# Altium footprint library cool_library.PcbLib: 1182 footprints (part 59 of 75)
Each footprint in its own frame and in the unit in brackets; x right, y up, seen from the top. Pads: shape width x height; smd on the part's side, far side on the other; paste and mask are expansions set on the pad; w line width, h text height; cw(c..) or ccw(c..) is an arc to the next point about the centre after c.
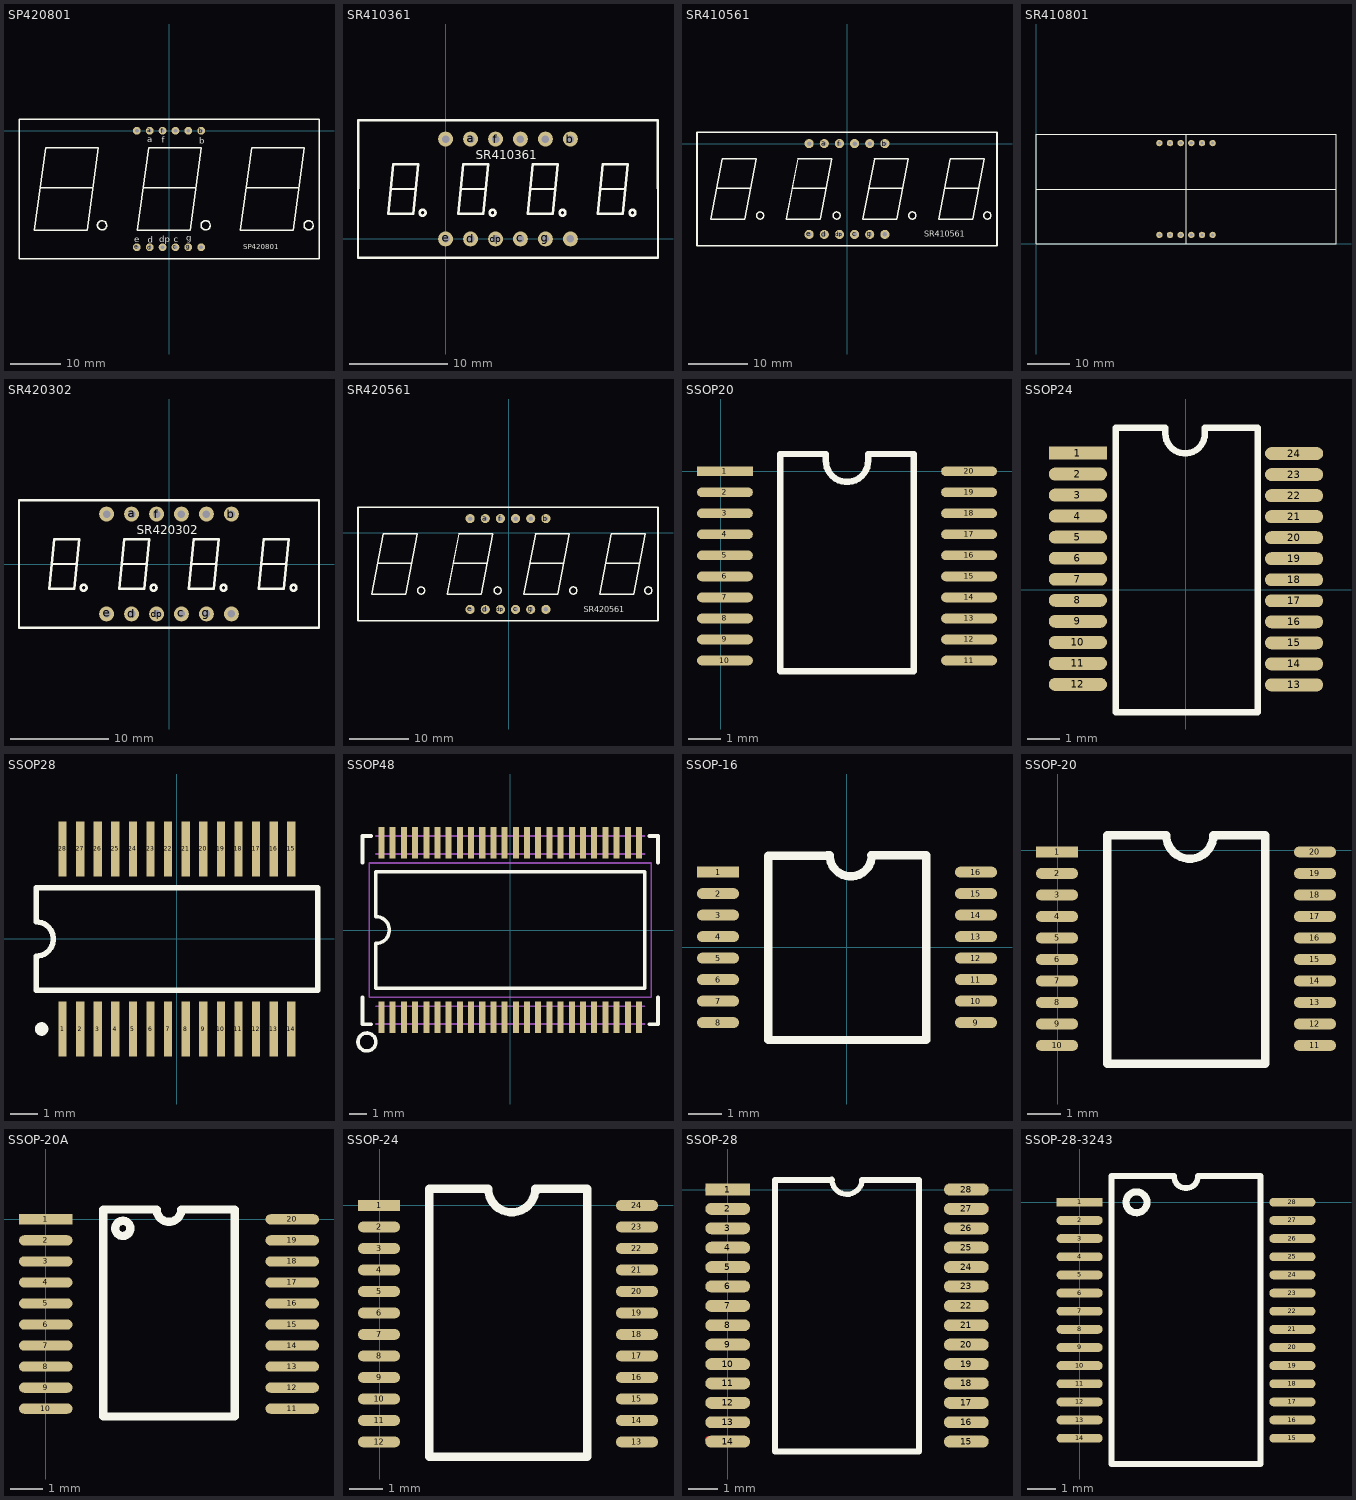
[diagram p58: the footprints below, top view; thin cyan lines are the x and y axes]

## SP420801 [mil]
pads (12):
  round 60 hole 30: a(-150,0) b(250,0) c(50,-905.51) com1(-250,0) com2(50,0) com3(150,0) d(-150,-905.51) dp(-50,-905.51) e(-250,-905.51) f(-50,0) g(150,-905.51) nc(250,-905.51)
Top Overlay:
  circle w10: c-520.43,-735 r35.43
  circle w10: c284.57,-735 r35.43
  circle w10: c1084.57,-735 r35.43
  lines w8: -1002.2,-439.37 -998.26,-443.31 ; -592.75,-443.31 -588.81,-439.37 ; -202.2,-439.37 -198.26,-443.31 ; 207.25,-443.31 211.19,-439.37 ; 597.8,-439.37 601.74,-443.31 ; 1007.25,-443.31 1011.19,-439.37
  lines w10: -998.26,-443.31 -592.75,-443.31 ; -198.26,-443.31 207.25,-443.31 ; 601.74,-443.31 1007.25,-443.31 ; -1165.35,-994.1 1165.35,-994.1 1165.35,88.58 -1165.35,88.58 -1165.35,-994.1 ; -1045.5,-774.02 -958.89,-132.28 -549.44,-132.28 -636.05,-774.02 -1045.5,-774.02 ; -245.5,-774.02 -158.89,-132.28 250.56,-132.28 163.94,-774.02 -245.5,-774.02 ; 554.5,-774.02 641.11,-132.28 1050.56,-132.28 963.95,-774.02 554.5,-774.02
  text "SP420801" at 575,-920 h40
  text "e" at -270,-865 h47.24
  text "d" at -165,-870 h47.24
  text "dp" at -75,-865 h47.24
  text "c" at 35,-865 h47.24
  text "g" at 135,-855 h47.24
  text "b" at 235,-100 h47.24
  text "f" at -55,-95 h47.24
  text "a" at -170,-90 h47.24

## SR410361 [mil]
height 50
pads (12):
  round 60 hole 30: a(100,400) b(500,400) c(300,0) com1(0,400) com2(300,400) com3(400,400) com4(500,0) d(100,0) dp(200,0) e(0,0) f(200,400) g(400,0)
Top Overlay:
  circle w10: c748.19,105 r11.81
  circle w10: c-91.81,105 r11.81
  circle w10: c188.19,105 r11.81
  circle w10: c468.19,105 r11.81
  lines w10: -350.39,475.59 850.39,475.59 ; -350,475.59 -350.41,-75.59 850.39,-75.59 850,475.59 ; -220,200 -120,200 ; 60,200 160,200 ; 340,200 440,200 ; 620,200 720,200 ; -230,100 -210,300 -110,300 -130,100 -230,100 ; 50,100 150,100 170,300 70,300 50,100 ; 330,100 430,100 450,300 350,300 330,100 ; 610,100 630,300 730,300 710,100 610,100
  text "SR410361" at 120,320 h35

## SR410561 [mil]
pads (12):
  round 60 hole 30: a(-150,0) b(250,0) c(50,-600) com1(-250,0) com2(50,0) com3(150,0) com4(250,-600) d(-150,-600) dp(-50,-600) e(-250,-600) f(-50,0) g(150,-600)
Top Overlay:
  circle w10: c-573.62,-475 r23.62
  circle w10: c-68.62,-475 r23.62
  circle w10: c431.38,-475 r23.62
  circle w10: c926.38,-475 r23.62
  lines w10: -854.33,-295 -640,-295 ; -358.27,-295 -140,-295 ; 145.67,-295 365,-295 ; 645.67,-295 865,-295 ; -990.16,-674.02 990.16,-674.02 990.16,74.02 -990.16,74.02 -990.16,-674.02 ; -900,-500 -823.46,-100 -600,-100 -676.54,-500 -900,-500 ; -400,-500 -323.45,-100 -100,-100 -176.54,-500 -400,-500 ; 105,-500 181.54,-100 405,-100 328.45,-500 105,-500 ; 605,-500 681.54,-100 905,-100 828.46,-500 605,-500
  text "SR410561" at 510,-615 h39.37

## SR410801 [mil]
pads (12):
  round 60 hole 30: 1(1157.48,80.71) 2(1257.48,80.71) 3(1357.48,80.71) 4(1457.48,80.71) 5(1557.48,80.71) 6(1657.48,80.71) 7(1657.48,942.91) 8(1557.48,942.91) 9(1457.48,942.91) 10(1357.48,942.91) 11(1257.48,942.91) 12(1157.48,942.91)
Top Overlay:
  lines w10: 0,511.81 2814.96,511.81 ; 1407.48,0 1407.48,1023.62 ; 0,0 2814.96,0 2814.96,1023.62 0,1023.62 0,0

## SR420302 [mil]
height 50
pads (12):
  round 60 hole 30: a(-150,200) b(250,200) c(50,-200) com1(-250,200) com2(50,200) com3(150,200) com4(250,-200) d(-150,-200) dp(-50,-200) e(-250,-200) f(-50,200) g(150,-200)
Top Overlay:
  circle w10: c498.19,-95 r11.81
  circle w10: c-341.81,-95 r11.81
  circle w10: c-61.81,-95 r11.81
  circle w10: c218.19,-95 r11.81
  lines w10: -470,0 -370,0 ; -190,0 -90,0 ; 90,0 190,0 ; 370,0 470,0 ; -600.39,-255.91 600.39,-255.91 600.39,255.91 -600.39,255.91 -600.39,-255.91 ; -480,-100 -460,100 -360,100 -380,-100 -480,-100 ; -200,-100 -100,-100 -80,100 -180,100 -200,-100 ; 80,-100 180,-100 200,100 100,100 80,-100 ; 360,-100 380,100 480,100 460,-100 360,-100
  text "SR420302" at -130,120 h35

## SR420561 [mil]
pads (12):
  round 60 hole 30: a(-155,95) b(245,95) c(45,-505) com1(-255,95) com2(45,95) com3(145,95) com4(245,-505) d(-155,-505) dp(-55,-505) e(-255,-505) f(-55,95) g(145,-505)
Top Overlay:
  circle w10: c921.38,-380 r23.62
  circle w10: c426.38,-380 r23.62
  circle w10: c-73.62,-380 r23.62
  circle w10: c-578.62,-380 r23.62
  lines w10: -859.33,-200 -645,-200 ; -363.27,-200 -145,-200 ; 140.67,-200 360,-200 ; 640.67,-200 860,-200 ; -995.16,-579.02 -995.16,169.02 985.16,169.02 985.16,-579.02 -995.16,-579.02 ; -905,-405 -681.54,-405 -605,-5 -828.46,-5 -905,-405 ; -405,-405 -181.54,-405 -105,-5 -328.45,-5 -405,-405 ; 100,-405 323.45,-405 400,-5 176.54,-5 100,-405 ; 600,-405 823.46,-405 900,-5 676.54,-5 600,-405
  text "SR420561" at 495,-525 h39.37

## SSOP20 [mm]
pads (20):
  rect 1.727x0.3 smd: 1(0.127,0)
  oval 1.727x0.3 smd: 2(0.127,-0.65) 3(0.127,-1.3) 4(0.127,-1.95) 5(0.127,-2.6) 6(0.127,-3.25) 7(0.127,-3.9) 8(0.127,-4.55) 9(0.127,-5.2) 10(0.127,-5.85) 11(7.673,-5.85) 12(7.673,-5.2) 13(7.673,-4.55) 14(7.673,-3.9) 15(7.673,-3.25) 16(7.673,-2.6) 17(7.673,-1.95) 18(7.673,-1.3) 19(7.673,-0.65) 20(7.673,0)
Top Overlay:
  lines w0.2: 1.835,-6.175 5.965,-6.175 5.965,0.533 4.555,0.533 4.555,0.325 cw(c3.9,0.325) 3.245,0.325 3.245,0.533 1.835,0.533 1.835,-6.175
3D body: height 1.79, standoff -0.05, extent -0.013,-6.52 7.887,0.78

## SSOP24 [mm]
pads (24):
  rect 1.8x0.4 smd: 1(-3.326,4.229)
  oval 1.8x0.4 smd: 2(-3.326,3.579) 3(-3.326,2.93) 4(-3.326,2.28) 5(-3.326,1.63) 6(-3.326,0.981) 7(-3.326,0.331) 8(-3.326,-0.319) 9(-3.326,-0.968) 10(-3.326,-1.618) 11(-3.326,-2.267) 12(-3.326,-2.917) 13(3.353,-2.932) 14(3.353,-2.282) 15(3.353,-1.632) 16(3.353,-0.983) 17(3.353,-0.333) 18(3.353,0.316) 19(3.353,0.966) 20(3.353,1.616) 21(3.353,2.265) 22(3.353,2.915) 23(3.353,3.565) 24(3.354,4.214)
Top Overlay:
  lines w0.2: -2.159,-3.785 -2.159,5.01 -0.622,5.01 -0.622,4.827 ccw(c-0.013,4.827) 0.597,4.827 0.597,5.01 2.235,5.01 2.235,-3.785 -2.159,-3.785
3D body: height 1.78, standoff -0.21, extent -3.924,-3.654 3.976,4.976

## SSOP28 [mm]
pads (28):
  rect 0.305x2.05 smd: 1(-4.225,-3.325) 2(-3.575,-3.325) 3(-2.925,-3.325) 4(-2.275,-3.325) 5(-1.625,-3.325) 6(-0.975,-3.325) 7(-0.325,-3.325) 8(0.325,-3.325) 9(0.975,-3.325) 10(1.625,-3.325) 11(2.275,-3.325) 12(2.925,-3.325) 13(3.575,-3.325) 14(4.225,-3.325) 15(4.225,3.325) 16(3.575,3.325) 17(2.925,3.325) 18(2.275,3.325) 19(1.625,3.325) 20(0.975,3.325) 21(0.325,3.325) 22(-0.325,3.325) 23(-0.975,3.325) 24(-1.625,3.325) 25(-2.275,3.325) 26(-2.925,3.325) 27(-3.575,3.325) 28(-4.225,3.325)
Top Overlay:
  circle w0.25: c-5,-3.325 r0.125
  lines w0.2: -5.2,-1.9 -5.2,-0.633 ccw(c-5.2,0) -5.2,0.633 -5.2,1.9 5.2,1.9 5.2,-1.9 -5.2,-1.9

## SSOP48 [mil] "48-Lead Shrink Small-Outline Package"
height 110
pads (48):
  rect 13.5x70 smd: 1(-287.5,-195) 2(-262.5,-195) 3(-237.5,-195) 4(-212.5,-195) 5(-187.5,-195) 6(-162.5,-195) 7(-137.5,-195) 8(-112.5,-195) 9(-87.5,-195) 10(-62.5,-195) 11(-37.5,-195) 12(-12.5,-195) 13(12.5,-195) 14(37.5,-195) 15(62.5,-195) 16(87.5,-195) 17(112.5,-195) 18(137.5,-195) 19(162.5,-195) 20(187.5,-195) 21(212.5,-195) 22(237.5,-195) 23(262.5,-195) 24(287.5,-195) 25(287.5,195) 26(262.5,195) 27(237.5,195) 28(212.5,195) 29(187.5,195) 30(162.5,195) 31(137.5,195) 32(112.5,195) 33(87.5,195) 34(62.5,195) 35(37.5,195) 36(12.5,195) 37(-12.5,195) 38(-37.5,195) 39(-62.5,195) 40(-87.5,195) 41(-112.5,195) 42(-137.5,195) 43(-162.5,195) 44(-187.5,195) 45(-212.5,195) 46(-237.5,195) 47(-262.5,195) 48(-287.5,195)
Top Overlay:
  circle w8: c-320,-250 r20
  lines w8: -330,-150 -330,-210 -310,-210 ; -330,150 -330,210 -310,210 ; 310,-210 330,-210 330,-150 ; 310,210 330,210 330,150 ; -300,-130 -300,-30 ccw(c-300,0) -300,30 -300,130 300,130 300,-130 -300,-130
Mechanical 1:
  lines w4: -300,-210 300,-210 ; -300,-170 300,-170 ; -300,170 300,170 ; -300,210 300,210 ; -315,-150 315,-150 315,150 -315,150 -315,-150

## SSOP-16 [mm]
pads (16):
  rect 1.27x0.33 smd: 1(-3.9,2.275)
  oval 1.27x0.33 smd: 2(-3.9,1.625) 3(-3.9,0.975) 4(-3.9,0.325) 5(-3.9,-0.325) 6(-3.9,-0.975) 7(-3.9,-1.625) 8(-3.9,-2.275) 9(3.9,-2.275) 10(3.9,-1.625) 11(3.9,-0.975) 12(3.9,-0.325) 13(3.9,0.325) 14(3.9,0.975) 15(3.9,1.625) 16(3.9,2.275)
Top Overlay:
  lines w0.254: -2.376,-2.8 -2.376,2.775 -0.606,2.775 -0.598,2.783 ; -2.325,-2.8 2.399,-2.8 2.399,2.775 2.391,2.783 0.725,2.783 ; -0.522,2.783 ccw(c0.113,2.783) 0.748,2.783

## SSOP-20 [mm]
pads (20):
  rect 1.27x0.33 smd: 1(-0.025,-0.051)
  oval 1.27x0.33 smd: 2(-0.025,-0.701) 3(-0.025,-1.351) 4(-0.025,-2.001) 5(-0.025,-2.651) 6(-0.025,-3.301) 7(-0.025,-3.951) 8(-0.025,-4.601) 9(-0.025,-5.251) 10(-0.025,-5.901) 11(7.775,-5.901) 12(7.775,-5.251) 13(7.775,-4.601) 14(7.775,-3.951) 15(7.775,-3.301) 16(7.775,-2.651) 17(7.775,-2.001) 18(7.775,-1.351) 19(7.775,-0.701) 20(7.775,-0.051)
Top Overlay:
  lines w0.254: 6.223,-6.45 1.499,-6.45 1.499,0.449 3.269,0.449 3.277,0.457 ccw(c3.99,0.457) 4.703,0.457 6.266,0.457 6.274,0.449 6.274,-6.45

## SSOP-20A [mil]
pads (20):
  rect 65x12.5 smd: 1(0,0)
  oval 65x12.5 smd: 2(0,-25.59) 3(0,-51.18) 4(0,-76.77) 5(0,-102.36) 6(0,-127.95) 7(0,-153.54) 8(0,-179.13) 9(0,-204.72) 10(0,-230.31) 11(300,-230.31) 12(300,-204.72) 13(300,-179.13) 14(300,-153.54) 15(300,-127.95) 16(300,-102.36) 17(300,-76.77) 18(300,-51.18) 19(300,-25.59) 20(300,0)
Top Overlay:
  circle w10: c93.78,-11 r9.22
  lines w10: 70,-240 230,-240 230,12 165,12 cw(c150,12) 135,12 70,12 70,-240

## SSOP-24 [mm]
pads (24):
  rect 1.27x0.33 smd: 1(-0.025,0)
  oval 1.27x0.33 smd: 2(-0.025,-0.65) 3(-0.025,-1.3) 4(-0.025,-1.95) 5(-0.025,-2.6) 6(-0.025,-3.25) 7(-0.025,-3.9) 8(-0.025,-4.55) 9(-0.025,-5.2) 10(-0.025,-5.85) 11(-0.025,-6.5) 12(-0.025,-7.15) 13(7.775,-7.15) 14(7.775,-6.5) 15(7.775,-5.85) 16(7.775,-5.2) 17(7.775,-4.55) 18(7.775,-3.9) 19(7.775,-3.25) 20(7.775,-2.6) 21(7.775,-1.95) 22(7.775,-1.3) 23(7.775,-0.65) 24(7.775,0)
Top Overlay:
  lines w0.254: 6.223,-7.6 1.499,-7.6 1.499,0.5 3.269,0.5 3.277,0.508 ccw(c3.99,0.508) 4.703,0.508 6.266,0.508 6.274,0.5 6.274,-7.6

## SSOP-28 [mm]
pads (28):
  rect 1.5x0.4 smd: 1(0,0)
  oval 1.5x0.4 smd: 2(0,-0.65) 3(0,-1.3) 4(0,-1.95) 5(0,-2.6) 6(0,-3.25) 7(0,-3.9) 8(0,-4.55) 9(0,-5.2) 10(0,-5.85) 11(0,-6.5) 12(0,-7.15) 13(0,-7.8) 14(0,-8.45) 15(8,-8.45) 16(8,-7.8) 17(8,-7.15) 18(8,-6.5) 19(8,-5.85) 20(8,-5.2) 21(8,-4.55) 22(8,-3.9) 23(8,-3.25) 24(8,-2.6) 25(8,-1.95) 26(8,-1.3) 27(8,-0.65) 28(8,0)
Top Layer:
  lines w0.254: -0.635,-8.382 -0.567,-8.45 0,-8.45 ; -0.635,0 0,0 ; 8,-8.45 8.059,-8.509 8.509,-8.509 ; 8,-5.2 8.007,-5.207 ; 8,-0.65 8.621,-0.65 ; 8,0 8.509,0 ; 8,0 8.509,0 ; 8,0 7.747,0 8.509,0 ; 8,0 8.509,0
Top Overlay:
  lines w0.178: 3.492,0.347 ccw(c4,0.347) 4.508,0.332
  lines w0.2: 3.492,0.325 1.585,0.325 1.585,-8.775 6.415,-8.775 6.415,0.325 4.508,0.325

## SSOP-28-3243 [mil]
pads (28):
  rect 65x12.5 smd: 1(0,0)
  oval 65x12.5 smd: 2(0,-25.59) 3(0,-51.18) 4(0,-76.77) 5(0,-102.36) 6(0,-127.95) 7(0,-153.54) 8(0,-179.13) 9(0,-204.72) 10(0,-230.31) 11(0,-255.91) 12(0,-281.5) 13(0,-307.09) 14(0,-332.68) 15(300,-332.68) 16(300,-307.09) 17(300,-281.5) 18(300,-255.91) 19(300,-230.31) 20(300,-204.72) 21(300,-179.13) 22(300,-153.54) 23(300,-127.95) 24(300,-102.36) 25(300,-76.77) 26(300,-51.18) 27(300,-25.59) 28(300,0)
Top Overlay:
  circle w10: c80.22,0 r14.78
  lines w8: 45,-369 255,-369 255,37 167,37 cw(c150,37) 133,37 45,37 45,-369